# Altium footprint library THT_Bauteile.PcbLib: 59 footprints (part 4 of 4)
Each footprint in its own frame and in the unit in brackets; x right, y up, seen from the top. Pads: shape width x height; smd on the part's side, far side on the other; paste and mask are expansions set on the pad; w line width, h text height; cw(c..) or ccw(c..) is an arc to the next point about the centre after c.
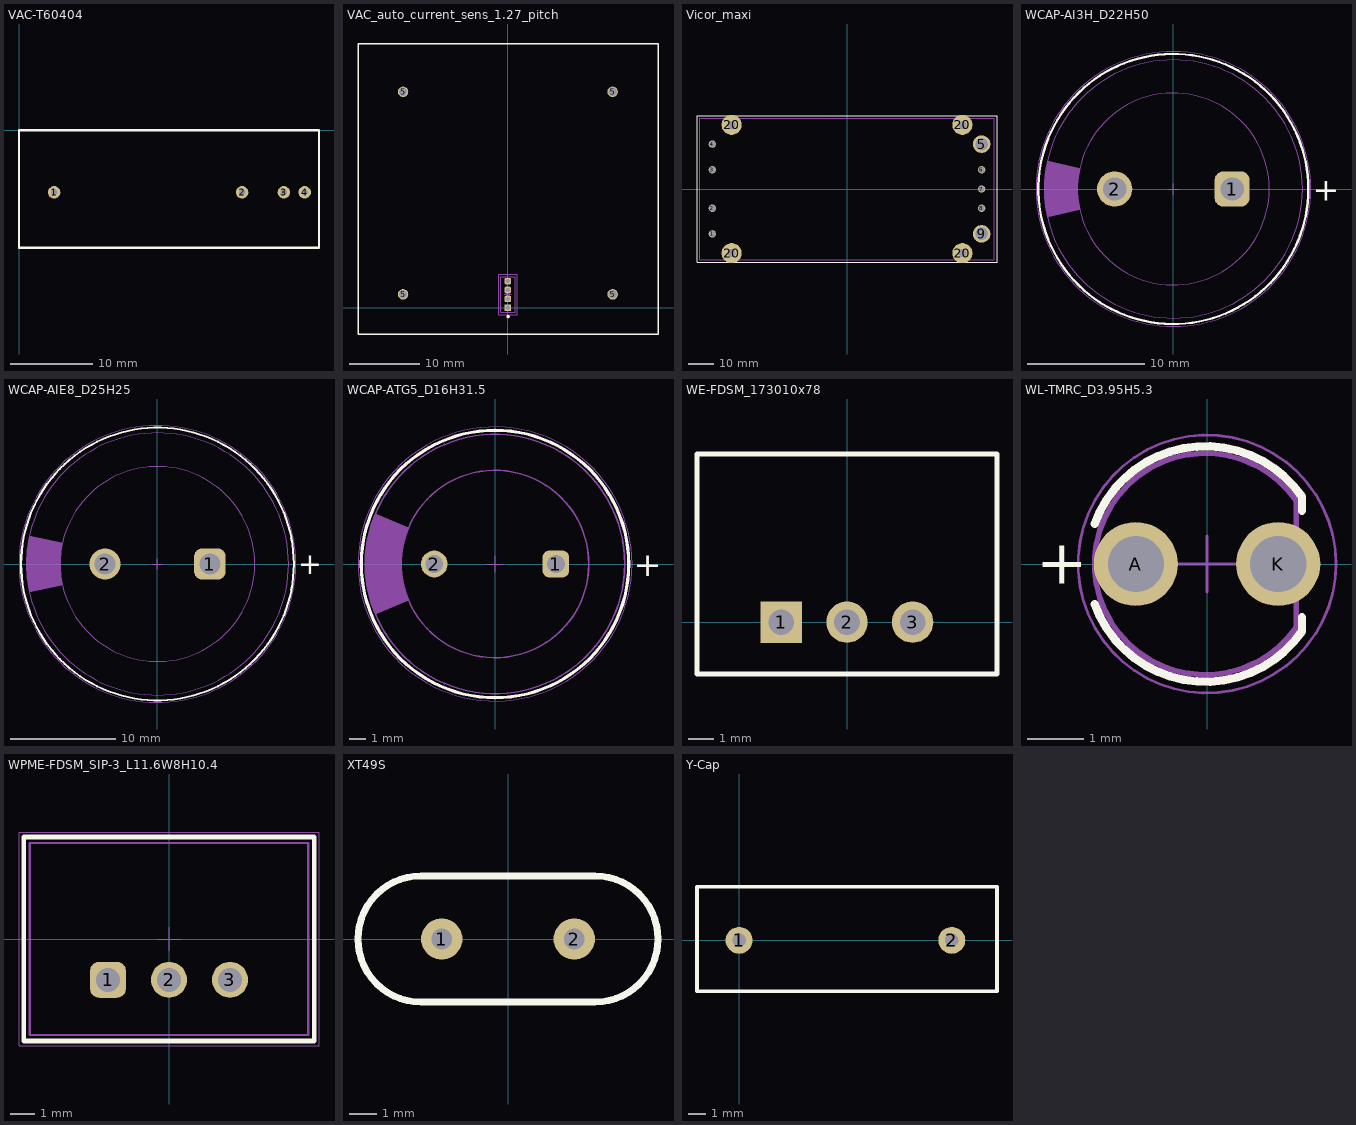
[diagram p3: the footprints below, top view; thin cyan lines are the x and y axes]

## VAC-T60404 [mm] "CurrentSensor"
pads (4):
  round 1.524 hole 0.8 square: 1(4.28,-7.55) 2(27.14,-7.55) 3(32.22,-7.55) 4(34.76,-7.55)
Top Overlay:
  lines w0.254: 0,-14.3 36.5,-14.3 36.5,0 0,0 0,-14.3
3D body "T60404-N4646-X160.STEP": height 28, standoff -4.5, extent 0.05,-14.1 36.55,0.2

## VAC_auto_current_sens_1.27_pitch [mm]
height 10.8
pads (8):
  rect 0.95x0.95 hole 0.6 square: 1(0,0)
  rrect50% 0.95x0.95 hole 0.6 square: 2(0,1.27) 3(0,2.54) 4(0,3.81)
  round 1.5 hole 1.2: 5(-15,1.91) 5(-15,30.91) 5(15,1.91) 5(15,30.91)
Top Overlay:
  circle w0.25: c0.04,-1.255 r0.125
  lines w0.2: -21.45,-3.8 -21.45,37.8 21.5,37.8 21.5,-3.8 -21.45,-3.8
Top Courtyard:
  lines w0.05: -1.325,-0.975 -1.325,4.805 1.365,4.805 1.365,-0.975 -1.325,-0.975
Top Component Center:
  lines w0.05: -0.5,1.925 0.5,1.925 ; 0,1.425 0,2.425
Top Component Outline:
  lines w0.1: -1.035,-0.625 -1.035,4.455 1.09,4.455 1.09,-0.625 -1.035,-0.625
Top Designator:
  text ".Designator" at 0.233,-1.574 h0.7
3D body "01_Current_Sensor_VAC_prt_efr17.stp": height 10.94, standoff -3.46, extent -21.253,-3.6 21.303,37.602

## Vicor_maxi [mm]
height 13.2
pads (13):
  round 2.9 hole 2.39: 1(-53.34,-17.78) 2(-53.34,-7.62) 3(-53.34,7.62) 4(-53.34,17.78) 6(53.34,7.62) 7(53.34,0) 8(53.34,-7.62)
  round 7 hole 4.93: 5(53.34,17.78) 9(53.34,-17.78)
  round 8 hole 3.264: 20(-45.72,-25.4) 20(-45.72,25.4) 20(45.72,-25.4) 20(45.72,25.4)
Top Overlay:
  lines w0.2: -59.42,-28.94 59.42,-28.94 59.42,28.94 -59.42,28.94 -59.42,-28.94
Top Component Outline:
  lines w0.2: -58.42,-27.94 58.42,-27.94 58.42,27.94 -58.42,27.94 -58.42,-27.94
3D body "37205r1-VxxAxxxxxxBG3P.STP": height 12.6, standoff -3.41, extent -58.354,-27.897 58.486,27.983

## WCAP-AI3H_D22H50 [mm] "Aluminium Electrolytic Snap-In Capacitors, 22x50mm"
height 50
pads (2):
  rrect50% 3x3 hole 2: 1(5,0)
  round 3 hole 2: 2(-5,0)
Top Overlay:
  circle w0.2: c0,0 r11.5
  text "+" at 11.85,-1 h2
Top 3D Body:
  circle w0.1: c0,0 r8.17
  circle w0.1: c0,0 r11
  region: -10.737,-2.391 -7.974,-1.779 -7.975,-1.776 -8.06,-1.337 -8.158,-0.447 -8.158,0.447 -8.06,1.337 -7.975,1.776 -7.974,1.779 -10.737,2.391 -10.802,2.097 -10.901,1.503 -10.967,0.903 -11,0.301 -11,-0.301 -10.967,-0.903 -10.901,-1.503 -10.802,-2.097
Top Courtyard:
  circle w0.05: c0,0 r11.7
  lines w0.05: -0.5,0 0.5,0 ; 0,-0.5 0,0.5
Top Component Outline:
  circle w0.1: c0,0 r11
  circle w0.1: c0,0 r8.17
  region: -10.737,-2.391 -7.974,-1.779 -7.975,-1.776 -8.06,-1.337 -8.158,-0.447 -8.158,0.447 -8.06,1.337 -7.975,1.776 -7.974,1.779 -10.737,2.391 -10.802,2.097 -10.901,1.503 -10.967,0.903 -11,0.301 -11,-0.301 -10.967,-0.903 -10.901,-1.503 -10.802,-2.097
Top Designator:
  text ".Designator" at -7.498,-0.5 h1.5
3D body "22x50.stp": height 51.09, standoff -6.05, extent -10.96,-10.996 11,10.993

## WCAP-AIE8_D25H25 [mm] "Aluminium Electrolytic Snap-In Capacitors, 25x25mm"
height 25
pads (2):
  rrect50% 3x3 hole 2: 1(5,0)
  round 3 hole 2: 2(-5,0)
Top Overlay:
  circle w0.2: c0,0 r13
  text "+" at 13.4,-1 h2
Top 3D Body:
  circle w0.1: c0,0 r12.5
  circle w0.1: c0,0 r9.29
  region: -12.204,-2.704 -9.066,-2.026 -9.068,-2.02 -9.12,-1.771 -9.203,-1.269 -9.259,-0.763 -9.287,-0.255 -9.287,0.255 -9.259,0.763 -9.203,1.269 -9.12,1.771 -9.068,2.02 -9.066,2.026 -12.204,2.704 -12.278,2.372 -12.389,1.699 -12.463,1.021 -12.5,0.341 -12.5,-0.341 -12.463,-1.021 -12.389,-1.699 -12.278,-2.372
Top Courtyard:
  circle w0.05: c0,0 r13.2
  lines w0.05: -0.5,0 0.5,0 ; 0,-0.5 0,0.5
Top Component Outline:
  circle w0.1: c0,0 r12.5
  circle w0.1: c0,0 r9.29
  region: -12.204,-2.704 -9.066,-2.026 -9.068,-2.02 -9.12,-1.771 -9.203,-1.269 -9.259,-0.763 -9.287,-0.255 -9.287,0.255 -9.259,0.763 -9.203,1.269 -9.12,1.771 -9.068,2.02 -9.066,2.026 -12.204,2.704 -12.278,2.372 -12.389,1.699 -12.463,1.021 -12.5,0.341 -12.5,-0.341 -12.463,-1.021 -12.389,-1.699 -12.278,-2.372
Top Designator:
  text ".Designator" at -7.498,-0.5 h1.5
3D body "25x25.stp": height 26.09, standoff -6.05, extent -12.46,-12.499 12.5,12.498

## WCAP-ATG5_D16H31.5 [mm] "Aluminum Electrolytic Capacitors, 16x31.5mm"
height 31.5
pads (2):
  rrect50% 1.65x1.65 hole 1.1: 1(3.75,0)
  round 1.65 hole 1.1: 2(-3.75,0)
Top Overlay:
  circle w0.2: c0,0 r8.25
  text "+" at 8.55,-0.75 h1.5
Top Courtyard:
  circle w0.05: c0,0 r8.45
  lines w0.05: -0.5,0 0.5,0 ; 0,-0.5 0,0.5
Top Component Outline:
  circle w0.1: c0,0 r8
  circle w0.1: c0,0 r5.78
  region: -7.369,-3.114 -5.324,-2.25 -5.325,-2.248 -5.431,-1.979 -5.601,-1.428 -5.715,-0.863 -5.773,-0.288 -5.773,0.288 -5.715,0.863 -5.601,1.428 -5.431,1.979 -5.325,2.248 -5.324,2.25 -7.369,3.114 -7.525,2.745 -7.761,1.98 -7.92,1.196 -8,0.4 -8,-0.4 -7.92,-1.196 -7.761,-1.98 -7.525,-2.745
Top Designator:
  text ".Designator" at -7.498,-0.5 h1.5
3D body "16x31.5x7.5x0.8.stp": height 31.81, standoff -19.91, extent -7.99,-7.997 8,7.998

## WE-FDSM_173010x78 [mm] "SIP-3, Body 11.6x8.5x10.5"
height 10.5
pads (3):
  rect 1.6x1.6 hole 1: 1(-2.54,0)
  round 1.6 hole 1: 2(0,0) 3(2.54,0)
Top Overlay:
  lines w0.2: -5.8,-2 5.8,-2 5.8,6.5 -5.8,6.5 -5.8,-2
Mechanical 15:
  lines w0.1: -0.5,0 0.5,0 ; 0,-0.5 0,0.5
3D body "173xxxx78.stp": height 10.6, standoff -3.9, extent -5.8,-2 5.8,6.5

## WL-TMRC_D3.95H5.3 [mm] "THT Mono-color Round Color LED, 2-leads"
height 5.3
pads (2):
  round 1.5 hole 1: A(-1.27,0) K(1.27,0)
Top Overlay:
  lines w0.15: -2.003,-0.719 ccw(c-0.03,0) 1.694,-1.199 1.694,-0.95 ; -2.003,0.719 cw(c-0.03,0) 1.694,1.199 1.694,0.95
  text "+" at -3.05,-0.35 h0.8
Top 3D Body:
  lines w0.1: 1.591,-1.128 cw(c-0.03,0) 1.591,1.128 1.591,-1.128
Top Courtyard:
  circle w0.05: c0,0 r2.3
  lines w0.05: -0.5,0 0.5,0 ; 0,-0.5 0,0.5
Top Component Outline:
  lines w0.1: 1.591,-1.128 cw(c-0.03,0) 1.591,1.128 1.591,-1.128
Top Designator:
  text ".Designator" at -4.998,-0.333 h1
3D body "15103xxx.stp": height 5.35, standoff -26.35, extent -1.991,-1.974 1.629,1.974

## WPME-FDSM_SIP-3_L11.6W8H10.4 [mm] "Fixed Step Down Regulator Module, SIP-3, body 11.60x80mm"
height 10.4
pads (3):
  rrect50% 1.5x1.5 hole 1: 1(-2.54,-1.7)
  round 1.5 hole 1: 2(0,-1.7) 3(2.54,-1.7)
Top Overlay:
  lines w0.2: -6.05,-4.25 6.05,-4.25 6.05,4.25 -6.05,4.25 -6.05,-4.25
Top 3D Body:
  lines w0.1: -5.8,-4 -5.8,4 5.8,4 5.8,-4 -5.8,-4
Top Assembly:
  lines w0.1: -5.8,-4 -5.8,4 5.8,4 5.8,-4 -5.8,-4
  text ".Designator" at -7.498,-0.5 h1.5
Top Courtyard:
  lines w0.05: -0.5,0 0.5,0 ; 0,-0.5 0,0.5 ; -6.25,-4.45 -6.25,4.45 6.25,4.45 6.25,-4.45 -6.25,-4.45
3D body "173010x35.stp": height 10.45, standoff -4.05, extent -5.8,-4 5.8,4

## XT49S [mil] "Vishay Crystal"
height 118.11
pads (2):
  round 60 hole 30: 1(-96.06,0) 2(96.06,0)
Top Overlay:
  lines w10: -125.98,-91.54 cw(c-125.98,0) -125.98,91.54 125.98,91.54 cw(c125.98,0) 125.98,-91.54 -125.98,-91.54

## Y-Cap [mil]
pads (2):
  round 60 hole 30: 1(0,0) 2(472.44,0)
Top Overlay:
  lines w7.87: -93.5,-113.19 -93.5,119.09 572.83,119.09 572.83,-113.19 -93.5,-113.19
3D body: height 787.4, standoff 19.68, extent -57.08,-70.86 535.44,72.84